# Altium footprint library RDM_ALT_PCB.PcbLib: 127 footprints (part 1 of 8)
Each footprint in its own frame and in the unit in brackets; x right, y up, seen from the top. Pads: shape width x height; smd on the part's side, far side on the other; paste and mask are expansions set on the pad; w line width, h text height; cw(c..) or ccw(c..) is an arc to the next point about the centre after c.
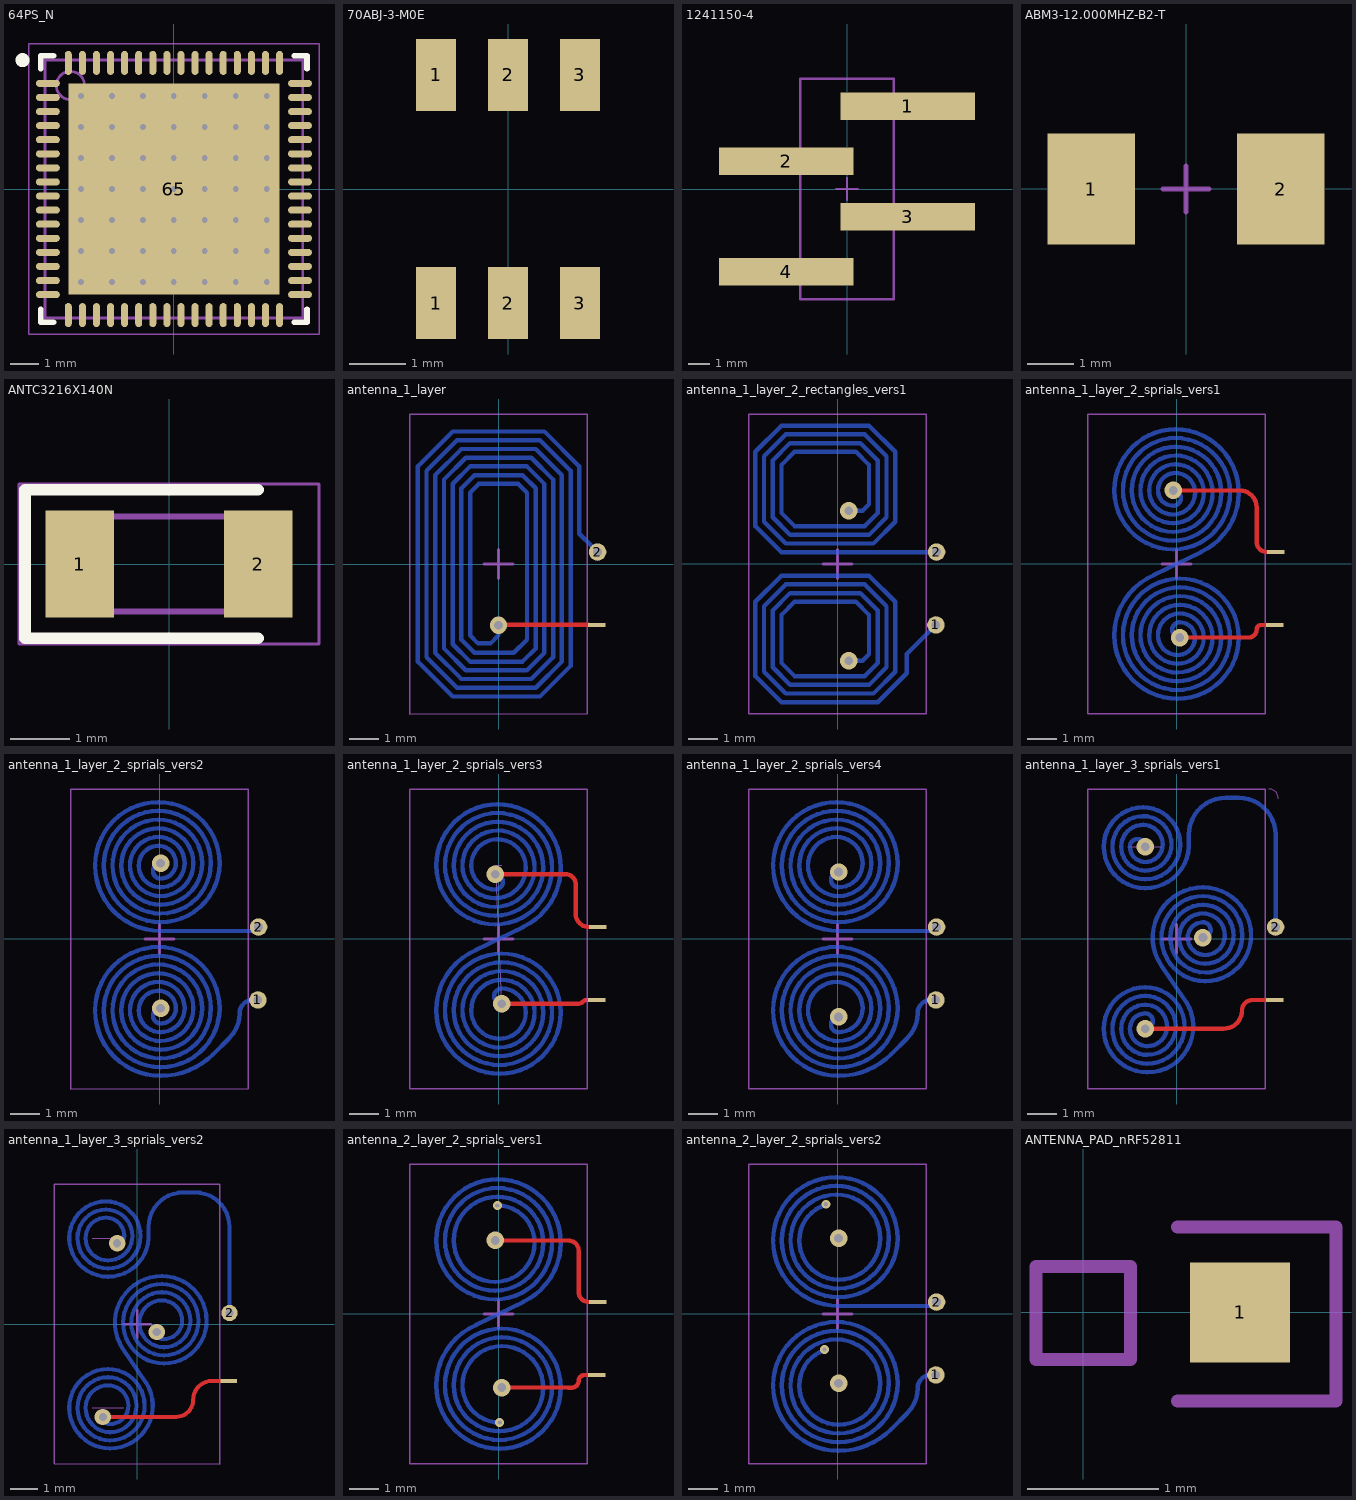
[diagram p0: the footprints below, top view; thin cyan lines are the x and y axes]

## 64PS_N [mm]
pads (65):
  oval 0.85x0.25 smd: 1(-4.475,3.75) 2(-4.475,3.25) 3(-4.475,2.75) 4(-4.475,2.25) 5(-4.475,1.75) 6(-4.475,1.25) 7(-4.475,0.75) 8(-4.475,0.25) 9(-4.475,-0.25) 10(-4.475,-0.75) 11(-4.475,-1.25) 12(-4.475,-1.75) 13(-4.475,-2.25) 14(-4.475,-2.75) 15(-4.475,-3.25) 16(-4.475,-3.75) 33(4.475,-3.75) 34(4.475,-3.25) 35(4.475,-2.75) 36(4.475,-2.25) 37(4.475,-1.75) 38(4.475,-1.25) 39(4.475,-0.75) 40(4.475,-0.25) 41(4.475,0.25) 42(4.475,0.75) 43(4.475,1.25) 44(4.475,1.75) 45(4.475,2.25) 46(4.475,2.75) 47(4.475,3.25) 48(4.475,3.75)
  oval 0.25x0.85 smd: 17(-3.75,-4.475) 18(-3.25,-4.475) 19(-2.75,-4.475) 20(-2.25,-4.475) 21(-1.75,-4.475) 22(-1.25,-4.475) 23(-0.75,-4.475) 24(-0.25,-4.475) 25(0.25,-4.475) 26(0.75,-4.475) 27(1.25,-4.475) 28(1.75,-4.475) 29(2.25,-4.475) 30(2.75,-4.475) 31(3.25,-4.475) 32(3.75,-4.475) 49(3.75,4.475) 50(3.25,4.475) 51(2.75,4.475) 52(2.25,4.475) 53(1.75,4.475) 54(1.25,4.475) 55(0.75,4.475) 56(0.25,4.475) 57(-0.25,4.475) 58(-0.75,4.475) 59(-1.25,4.475) 60(-1.75,4.475) 61(-2.25,4.475) 62(-2.75,4.475) 63(-3.25,4.475) 64(-3.75,4.475)
  rect 7.5x7.5 smd: 65(0,0)
via -3.3,3.3 diameter 0.5 hole 0.2
via -2.2,3.3 diameter 0.5 hole 0.2
via -1.1,3.3 diameter 0.5 hole 0.2
via 0,3.3 diameter 0.5 hole 0.2
via 1.1,3.3 diameter 0.5 hole 0.2
via 2.2,3.3 diameter 0.5 hole 0.2
via 3.3,3.3 diameter 0.5 hole 0.2
via -3.3,2.2 diameter 0.5 hole 0.2
via -2.2,2.2 diameter 0.5 hole 0.2
via -1.1,2.2 diameter 0.5 hole 0.2
via 0,2.2 diameter 0.5 hole 0.2
via 1.1,2.2 diameter 0.5 hole 0.2
via 2.2,2.2 diameter 0.5 hole 0.2
via 3.3,2.2 diameter 0.5 hole 0.2
via -3.3,1.1 diameter 0.5 hole 0.2
via -2.2,1.1 diameter 0.5 hole 0.2
via -1.1,1.1 diameter 0.5 hole 0.2
via 0,1.1 diameter 0.5 hole 0.2
via 1.1,1.1 diameter 0.5 hole 0.2
via 2.2,1.1 diameter 0.5 hole 0.2
via 3.3,1.1 diameter 0.5 hole 0.2
via -3.3,0 diameter 0.5 hole 0.2
via -2.2,0 diameter 0.5 hole 0.2
via -1.1,0 diameter 0.5 hole 0.2
via 0,0 diameter 0.5 hole 0.2
via 1.1,0 diameter 0.5 hole 0.2
via 2.2,0 diameter 0.5 hole 0.2
via 3.3,0 diameter 0.5 hole 0.2
via -3.3,-1.1 diameter 0.5 hole 0.2
via -2.2,-1.1 diameter 0.5 hole 0.2
via -1.1,-1.1 diameter 0.5 hole 0.2
via 0,-1.1 diameter 0.5 hole 0.2
via 1.1,-1.1 diameter 0.5 hole 0.2
via 2.2,-1.1 diameter 0.5 hole 0.2
via 3.3,-1.1 diameter 0.5 hole 0.2
via -3.3,-2.2 diameter 0.5 hole 0.2
via -2.2,-2.2 diameter 0.5 hole 0.2
via -1.1,-2.2 diameter 0.5 hole 0.2
via 0,-2.2 diameter 0.5 hole 0.2
via 1.1,-2.2 diameter 0.5 hole 0.2
via 2.2,-2.2 diameter 0.5 hole 0.2
via 3.3,-2.2 diameter 0.5 hole 0.2
via -3.3,-3.3 diameter 0.5 hole 0.2
via -2.2,-3.3 diameter 0.5 hole 0.2
via -1.1,-3.3 diameter 0.5 hole 0.2
via 0,-3.3 diameter 0.5 hole 0.2
via 1.1,-3.3 diameter 0.5 hole 0.2
via 2.2,-3.3 diameter 0.5 hole 0.2
via 3.3,-3.3 diameter 0.5 hole 0.2
Top Overlay:
  circle w0.25: c-5.375,4.575 r0.125
  lines w0.2: -4.725,-4.275 -4.725,-4.725 -4.275,-4.725 ; -4.725,4.275 -4.725,4.725 -4.275,4.725 ; 4.275,-4.725 4.725,-4.725 4.725,-4.275 ; 4.275,4.725 4.725,4.725 4.725,4.275
Mechanical 13:
  circle w0.1: c-3.675,3.675 r0.5
  lines w0.1: -4.575,-4.575 -4.575,4.575 4.575,4.575 4.575,-4.575 -4.575,-4.575
Mechanical 15:
  lines w0.05: -5.15,-5.15 -5.15,5.15 5.15,5.15 5.15,-5.15 -5.15,-5.15
  lines w0.1: -0.5,0 0.5,0 ; 0,-0.5 0,0.5
3D body: height 1, standoff 0, extent -4.575,-4.575 4.575,4.575

## 70ABJ-3-M0E [mm] "3 Position Spring Compression Contact, Male Connector Surface Mount"
height 3.33
pads (6):
  rect 0.71x1.27 smd: 1(-1.27,-2.015) 1(-1.27,2.015) 2(0,-2.015) 2(0,2.015) 3(1.27,-2.015) 3(1.27,2.015)

## 1241150-4 [mm] "Headers & Wire Housings 4P SINGLE ROW"
height 3.7
pads (4):
  rect 6.2x1.27 smd: 1(2.8,3.81) 2(-2.8,1.27) 3(2.8,-1.27) 4(-2.8,-3.81)
Mechanical 13:
  lines w0.1: -2.15,-5.08 2.15,-5.08 2.15,5.08 -2.15,5.08 -2.15,-5.08
Mechanical 15:
  lines w0.1: -0.5,0 0.5,0 ; 0,-0.5 0,0.5
3D body "CONN_1241150-4_TYCO.stp": height 8.61, standoff 0, extent -2.172,-5.08 2.172,5.08

## ABM3-12.000MHZ-B2-T [mm] "ABM3-12.000MHZ-B2-T"
height 1.3
pads (2):
  rect 1.9x2.4 smd: 1(-2.05,0) 2(2.05,0)
Mechanical 15:
  lines w0.1: -0.5,0 0.5,0 ; 0,-0.5 0,0.5
3D body "ABM3.STEP": height 1.3, standoff 0, extent -2.5,-1.6 2.5,1.6

## ANTC3216X140N [mm]
pads (2):
  rect 1.15x1.8 smd: 1(-1.5,0) 2(1.5,0)
Top Overlay:
  lines w0.2: 1.5,-1.25 -2.425,-1.25 -2.425,1.25 1.5,1.25
Mechanical 15:
  lines w0.1: -1.6,0.225 -1.025,0.8 ; -1.6,-0.8 1.6,-0.8 1.6,0.8 -1.6,0.8 -1.6,-0.8
Mechanical 20:
  lines w0.05: -2.525,-1.35 2.525,-1.35 2.525,1.35 -2.525,1.35 -2.525,-1.35

## antenna_1_layer [mm] "antenna 1 layer"
height 3.7
pads (2):
  rect 0.6x0.15 smd paste-1: 1(3.377,-2.093)
  round 0.6 hole 0.3: 2(3.402,0.411)
via 0,-2.1 diameter 0.6 hole 0.3
Top Layer:
  lines w0.152: 0,-2.093 3.1,-2.093
Bottom Layer:
  lines w0.15: 0,-2.1 0,-2.45 -0.275,-2.725 -0.7,-2.725 -0.973,-2.452 -0.973,2.452 -0.675,2.75 0.675,2.75 0.977,2.448 0.977,-2.6 ; 0.975,-2.6 0.525,-3.05 -0.825,-3.05 -1.275,-2.6 -1.275,2.6 -0.825,3.05 0.825,3.05 1.275,2.6 1.275,-2.9 0.825,-3.35 -0.975,-3.35 -1.573,-2.752 -1.573,2.752 -0.975,3.35 0.975,3.35 1.577,2.748 1.577,-3.048 0.975,-3.65 -1.125,-3.65 -1.873,-2.902 -1.873,2.902 -1.125,3.65 1.125,3.65 1.875,2.9 1.875,-3.2 1.125,-3.95 -1.275,-3.95 -2.173,-3.052 -2.173,3.052 -1.275,3.95 1.275,3.95 2.177,3.048 ; 2.177,3.05 2.177,-3.325 2.177,-3.348 1.275,-4.25 -1.425,-4.25 -2.473,-3.202 -2.473,-3.175 -2.473,3.202 -1.425,4.25 1.425,4.25 2.475,3.2 2.475,-3.5 1.425,-4.55 -1.575,-4.55 -2.775,-3.35 -2.775,3.35 -1.575,4.55 1.575,4.55 2.775,3.35 2.775,1.038 3.207,0.607
Mechanical 15:
  lines w0.05: -3.05,-5.15 3.05,-5.15 3.05,5.15 -3.05,5.15 -3.05,-5.15
  lines w0.1: -0.5,0 0.5,0 ; 0,-0.5 0,0.5

## antenna_1_layer_2_rectangles_vers1 [mm] "antenna 1 layer"
pads (2):
  round 0.6 hole 0.3: 1(3.377,-2.093) 2(3.402,0.411)
via 0.39,-3.325 diameter 0.6 hole 0.3
via 0.389,1.829 diameter 0.6 hole 0.3
Mid-Layer 2:
  lines w0.15: 0.388,1.829 0.39,-3.325
Bottom Layer:
  lines w0.15: 0.395,-3.316 0.864,-3.316 1.081,-3.098 1.081,-1.748 0.631,-1.298 -1.475,-1.298 -1.925,-1.748 -1.925,-3.398 -1.475,-3.848 0.931,-3.848 1.381,-3.398 1.381,-1.598 0.783,-1 -1.627,-1 -2.225,-1.598 -2.225,-3.548 -1.623,-4.15 1.08,-4.15 1.681,-3.548 1.681,-1.448 0.933,-0.7 -1.777,-0.7 -2.525,-1.448 -2.525,-3.698 -1.775,-4.448 1.231,-4.448 1.981,-3.698 1.981,-1.298 1.083,-0.4 -1.927,-0.4 -2.825,-1.298 -2.825,-3.848 -1.923,-4.75 1.356,-4.75 ; 0.395,1.834 0.864,1.834 1.081,2.052 1.081,3.402 0.631,3.852 -1.475,3.852 -1.925,3.402 -1.925,1.752 -1.475,1.302 0.931,1.302 1.381,1.752 1.381,3.552 0.783,4.15 -1.627,4.15 -2.225,3.552 -2.225,1.602 -1.623,1 1.08,1 1.681,1.602 1.681,3.702 0.933,4.45 -1.777,4.45 -2.525,3.702 -2.525,1.452 -1.775,0.702 1.231,0.702 1.981,1.452 1.981,3.852 1.083,4.75 -1.927,4.75 -2.825,3.852 -2.825,1.302 -1.923,0.4 1.801,0.4 3.1,0.4 ; 1.38,-4.75 1.356,-4.75 ; 3.16,-2.31 2.8,-2.67 2.378,-3.092 2.378,-3.75 1.378,-4.75 1.356,-4.75
Mechanical 15:
  lines w0.05: -3.05,-5.15 -3.05,5.15 3.05,5.15 3.05,-5.15 -3.05,-5.15
  lines w0.1: -0.5,0 0.5,0 ; 0,-0.5 0,0.5
3D body: height 0.25, standoff 0, extent 5.15,1.65 5.15,1.65

## antenna_1_layer_2_sprials_vers1 [mm] "antenna 1 layer"
pads (2):
  rect 0.6x0.15 smd: 1(3.377,-2.093) 2(3.402,0.411)
via -0.113,2.525 diameter 0.6 hole 0.3
via 0.112,-2.525 diameter 0.6 hole 0.3
Top Layer:
  lines w0.15: -0.113,2.525 2.175,2.525 cw(c2.175,1.95) 2.75,1.95 2.75,0.761 ccw(c3.1,0.761) 3.1,0.411 ; 0.112,-2.525 0.994,-2.525 ; 0.937,-2.525 2.475,-2.525 ccw(c2.475,-2.25) 2.75,-2.25 cw(c2.907,-2.25) 2.907,-2.093 3.1,-2.093
Bottom Layer:
  lines w0.15: -0.113,2.525 cw(c-0.113,2.263) -0.113,2 cw(c-0.113,2.525) -0.638,2.525 cw(c-0.038,2.525) -0.038,3.125 cw(c-0.038,2.45) 0.637,2.45 cw(c-0.113,2.45) -0.113,1.7 cw(c-0.113,2.525) -0.938,2.525 cw(c-0.038,2.525) -0.038,3.425 cw(c-0.038,2.45) 0.937,2.45 cw(c-0.113,2.45) -0.113,1.4 cw(c-0.113,2.525) -1.238,2.525 cw(c-0.038,2.525) -0.038,3.725 cw(c-0.038,2.45) 1.237,2.45 cw(c-0.113,2.45) -0.113,1.1 cw(c-0.113,2.525) -1.538,2.525 cw(c-0.038,2.525) -0.038,4.025 cw(c-0.038,2.45) 1.537,2.45 cw(c-0.113,2.45) -0.113,0.8 cw(c-0.113,2.525) -1.838,2.525 cw(c-0.038,2.525) -0.038,4.325 cw(c-0.038,2.45) 1.837,2.45 cw(c-0.113,2.45) -0.113,0.5 cw(c-0.113,2.525) -2.138,2.525 cw(c-0.038,2.525) -0.038,4.625 cw(c-0.038,2.45) 2.137,2.45 cw(c-0.113,2.45) 0.855,0.419 -0.782,-0.386 ccw(c0.112,-2.45) -2.137,-2.45 ccw(c0.037,-2.45) 0.037,-4.625 ccw(c0.037,-2.525) 2.137,-2.525 ccw(c0.112,-2.525) 0.112,-0.5 ccw(c0.112,-2.45) -1.837,-2.45 ccw(c0.037,-2.45) 0.037,-4.325 ccw(c0.037,-2.525) 1.837,-2.525 ccw(c0.112,-2.525) 0.112,-0.8 ccw(c0.112,-2.45) -1.537,-2.45 ccw(c0.037,-2.45) 0.037,-4.025 ccw(c0.037,-2.525) 1.537,-2.525 ccw(c0.112,-2.525) 0.112,-1.1 ccw(c0.112,-2.45) -1.237,-2.45 ccw(c0.037,-2.45) 0.037,-3.725 ccw(c0.037,-2.525) 1.237,-2.525 ccw(c0.112,-2.525) 0.112,-1.4 ccw(c0.112,-2.45) -0.937,-2.45 ccw(c0.037,-2.45) 0.037,-3.425 ccw(c0.037,-2.525) 0.937,-2.525 ccw(c0.112,-2.525) 0.112,-1.7 ccw(c0.112,-2.45) -0.637,-2.45 ccw(c0.037,-2.45) 0.037,-3.125 ccw(c0.037,-2.525) 0.637,-2.525 ccw(c0.112,-2.525) 0.112,-2 ccw(c0.112,-2.262) 0.112,-2.525
Mechanical 15:
  lines w0.013: -0.113,2.525 0.112,2.525
  lines w0.05: -3.05,-5.15 -3.05,5.15 3.05,5.15 3.05,-5.15 -3.05,-5.15
  lines w0.1: -0.5,0 0.5,0 ; 0,-0.5 0,0.5

## antenna_1_layer_2_sprials_vers2 [mm] "antenna 1 layer"
pads (2):
  round 0.6 hole 0.3: 1(3.377,-2.093) 2(3.402,0.411)
via 0.038,-2.376 diameter 0.6 hole 0.3
via 0.038,2.601 diameter 0.6 hole 0.3
Mid-Layer 2:
  lines w0.15: 0.038,-2.376 0.038,2.601
Bottom Layer:
  lines w0.15: 0.038,-2.376 ccw(c0.038,-2.638) 0.038,-2.901 ccw(c0.038,-2.376) 0.562,-2.376 ccw(c-0.038,-2.376) -0.038,-1.776 ccw(c-0.038,-2.451) -0.713,-2.451 ccw(c0.038,-2.451) 0.038,-3.201 ccw(c0.038,-2.376) 0.863,-2.376 ccw(c-0.038,-2.376) -0.038,-1.476 ccw(c-0.038,-2.451) -1.012,-2.451 ccw(c0.038,-2.451) 0.038,-3.501 ccw(c0.038,-2.376) 1.162,-2.376 ccw(c-0.038,-2.376) -0.038,-1.176 ccw(c-0.038,-2.451) -1.312,-2.451 ccw(c0.038,-2.451) 0.038,-3.801 ccw(c0.038,-2.376) 1.462,-2.376 ccw(c-0.038,-2.376) -0.038,-0.876 ccw(c-0.038,-2.451) -1.612,-2.451 ccw(c0.038,-2.451) 0.038,-4.101 ccw(c0.038,-2.376) 1.762,-2.376 ccw(c-0.038,-2.376) -0.038,-0.576 ccw(c-0.038,-2.451) -1.912,-2.451 ccw(c0.038,-2.451) 0.038,-4.401 ccw(c0.038,-2.376) 2.062,-2.376 ccw(c-0.038,-2.376) -0.038,-0.276 ccw(c-0.038,-2.451) -2.212,-2.451 ccw(c0.038,-2.451) 0.038,-4.701 ccw(c0.038,-2.137) 1.85,-3.95 2.396,-3.404 ccw(c1.543,-2.55) 2.75,-2.55 cw(c3.207,-2.55) 3.101,-2.105 ; 0.038,2.601 ccw(c0.038,2.338) 0.038,2.076 ccw(c0.038,2.601) 0.562,2.601 ccw(c-0.038,2.601) -0.038,3.201 ccw(c-0.038,2.526) -0.713,2.526 ccw(c0.038,2.526) 0.038,1.776 ccw(c0.038,2.601) 0.863,2.601 ccw(c-0.038,2.601) -0.038,3.501 ccw(c-0.038,2.526) -1.012,2.526 ccw(c0.038,2.526) 0.038,1.476 ccw(c0.038,2.601) 1.162,2.601 ccw(c-0.038,2.601) -0.038,3.801 ccw(c-0.038,2.526) -1.312,2.526 ccw(c0.038,2.526) 0.038,1.176 ccw(c0.038,2.601) 1.462,2.601 ccw(c-0.038,2.601) -0.038,4.101 ccw(c-0.038,2.526) -1.612,2.526 ccw(c0.038,2.526) 0.038,0.876 ccw(c0.038,2.601) 1.762,2.601 ccw(c-0.038,2.601) -0.038,4.401 ccw(c-0.038,2.526) -1.912,2.526 ccw(c0.038,2.526) 0.038,0.576 ccw(c0.038,2.601) 2.062,2.601 ccw(c-0.038,2.601) -0.038,4.701 ccw(c-0.038,2.526) -2.212,2.526 ccw(c0.038,2.526) 0.038,0.276 3.2,0.276
Mechanical 15:
  lines w0.013: -0.188,2.601 0.038,2.601
  lines w0.05: -3.05,-5.15 -3.05,5.15 3.05,5.15 3.05,-5.15 -3.05,-5.15
  lines w0.1: -0.5,0 0.5,0 ; 0,-0.5 0,0.5
3D body: height 0.25, standoff 0, extent 3.742,1.578 3.742,1.578

## antenna_1_layer_2_sprials_vers3 [mm] "antenna 1 layer"
pads (2):
  rect 0.6x0.15 smd: 1(3.377,-2.093) 2(3.402,0.411)
via -0.113,2.225 diameter 0.6 hole 0.3
via 0.112,-2.225 diameter 0.6 hole 0.3
Top Layer:
  lines w0.15: -0.113,2.225 2.3,2.225 cw(c2.3,1.875) 2.65,1.875 2.65,0.861 ccw(c3.1,0.861) 3.1,0.411 ; 0.112,-2.225 2.65,-2.227 2.715,-2.227 ccw(c2.715,-1.965) 2.9,-2.15 cw(c3.037,-2.287) 3.037,-2.093
Top Layer keep-out:
  lines w0.15: 3.037,-2.093 3.15,-2.093
Bottom Layer:
  lines w0.15: -0.113,2.225 cw(c-0.113,1.963) -0.113,1.7 cw(c-0.113,2.525) -0.938,2.525 cw(c-0.038,2.525) -0.038,3.425 cw(c-0.038,2.45) 0.937,2.45 cw(c-0.113,2.45) -0.113,1.4 cw(c-0.113,2.525) -1.238,2.525 cw(c-0.038,2.525) -0.038,3.725 cw(c-0.038,2.45) 1.237,2.45 cw(c-0.113,2.45) -0.113,1.1 cw(c-0.113,2.525) -1.538,2.525 cw(c-0.038,2.525) -0.038,4.025 cw(c-0.038,2.45) 1.537,2.45 cw(c-0.113,2.45) -0.113,0.8 cw(c-0.113,2.525) -1.838,2.525 cw(c-0.038,2.525) -0.038,4.325 cw(c-0.038,2.45) 1.837,2.45 cw(c-0.113,2.45) -0.113,0.5 cw(c-0.113,2.525) -2.138,2.525 cw(c-0.038,2.525) -0.038,4.625 cw(c-0.038,2.45) 2.137,2.45 cw(c-0.113,2.45) 0.855,0.419 -0.782,-0.386 ccw(c0.112,-2.45) -2.137,-2.45 ccw(c0.037,-2.45) 0.037,-4.625 ccw(c0.037,-2.525) 2.137,-2.525 ccw(c0.112,-2.525) 0.112,-0.5 ccw(c0.112,-2.45) -1.837,-2.45 ccw(c0.037,-2.45) 0.037,-4.325 ccw(c0.037,-2.525) 1.837,-2.525 ccw(c0.112,-2.525) 0.112,-0.8 ccw(c0.112,-2.45) -1.537,-2.45 ccw(c0.037,-2.45) 0.037,-4.025 ccw(c0.037,-2.525) 1.537,-2.525 ccw(c0.112,-2.525) 0.112,-1.1 ccw(c0.112,-2.45) -1.237,-2.45 ccw(c0.037,-2.45) 0.037,-3.725 ccw(c0.037,-2.525) 1.237,-2.525 ccw(c0.112,-2.525) 0.112,-1.4 ccw(c0.112,-2.45) -0.937,-2.45 ccw(c0.037,-2.45) 0.037,-3.425 ccw(c0.037,-2.525) 0.937,-2.525 ccw(c0.112,-2.525) 0.112,-1.7 ccw(c0.112,-1.962) 0.112,-2.225
Mechanical 15:
  lines w0.013: 0.112,-2.525 -0.113,2.525 0.112,2.525
  lines w0.05: -3.05,-5.15 -3.05,5.15 3.05,5.15 3.05,-5.15 -3.05,-5.15
  lines w0.1: -0.5,0 0.5,0 ; 0,-0.5 0,0.5

## antenna_1_layer_2_sprials_vers4 [mm] "antenna 1 layer"
pads (2):
  round 0.6 hole 0.3: 1(3.377,-2.093) 2(3.402,0.411)
via 0.037,2.301 diameter 0.6 hole 0.3
via 0.037,-2.676 diameter 0.6 hole 0.3
Mid-Layer 2:
  lines w0.15: 0.037,-2.676 0.037,2.301
Bottom Layer:
  lines w0.15: 0.037,-2.676 ccw(c0.037,-2.938) 0.037,-3.201 ccw(c0.037,-2.376) 0.862,-2.376 ccw(c-0.038,-2.376) -0.038,-1.476 ccw(c-0.038,-2.451) -1.013,-2.451 ccw(c0.037,-2.451) 0.037,-3.501 ccw(c0.037,-2.376) 1.162,-2.376 ccw(c-0.038,-2.376) -0.038,-1.176 ccw(c-0.038,-2.451) -1.313,-2.451 ccw(c0.037,-2.451) 0.037,-3.801 ccw(c0.037,-2.376) 1.462,-2.376 ccw(c-0.038,-2.376) -0.038,-0.876 ccw(c-0.038,-2.451) -1.613,-2.451 ccw(c0.037,-2.451) 0.037,-4.101 ccw(c0.037,-2.376) 1.762,-2.376 ccw(c-0.038,-2.376) -0.038,-0.576 ccw(c-0.038,-2.451) -1.913,-2.451 ccw(c0.037,-2.451) 0.037,-4.401 ccw(c0.037,-2.376) 2.062,-2.376 ccw(c-0.038,-2.376) -0.038,-0.276 ccw(c-0.038,-2.451) -2.212,-2.451 ccw(c0.037,-2.451) 0.037,-4.701 ccw(c0.037,-2.137) 1.85,-3.95 2.396,-3.404 ccw(c1.543,-2.55) 2.75,-2.55 cw(c3.207,-2.55) 3.101,-2.105 ; 0.037,2.301 ccw(c0.037,2.038) 0.037,1.776 ccw(c0.037,2.601) 0.862,2.601 ccw(c-0.038,2.601) -0.038,3.501 ccw(c-0.038,2.526) -1.013,2.526 ccw(c0.037,2.526) 0.037,1.476 ccw(c0.037,2.601) 1.162,2.601 ccw(c-0.038,2.601) -0.038,3.801 ccw(c-0.038,2.526) -1.313,2.526 ccw(c0.037,2.526) 0.037,1.176 ccw(c0.037,2.601) 1.462,2.601 ccw(c-0.038,2.601) -0.038,4.101 ccw(c-0.038,2.526) -1.613,2.526 ccw(c0.037,2.526) 0.037,0.876 ccw(c0.037,2.601) 1.762,2.601 ccw(c-0.038,2.601) -0.038,4.401 ccw(c-0.038,2.526) -1.913,2.526 ccw(c0.037,2.526) 0.037,0.576 ccw(c0.037,2.601) 2.062,2.601 ccw(c-0.038,2.601) -0.038,4.701 ccw(c-0.038,2.526) -2.212,2.526 ccw(c0.037,2.526) 0.037,0.276 3.2,0.276
Mechanical 15:
  lines w0.05: -3.05,-5.15 3.05,-5.15 3.05,5.15 -3.05,5.15 -3.05,-5.15
  lines w0.1: -0.5,0 0.5,0 ; 0,-0.5 0,0.5
3D body: height 0.25, standoff 0, extent -3.953,1.679 -3.953,1.679

## antenna_1_layer_3_sprials_vers1 [mm] "antenna 1 layer"
pads (2):
  rect 0.6x0.15 smd: 1(3.377,-2.093)
  round 0.6 hole 0.3: 2(3.402,0.411)
via -1.074,3.17 diameter 0.6 hole 0.3
via 0.909,0.05 diameter 0.6 hole 0.3
via -1.074,-3.08 diameter 0.6 hole 0.3
Top Layer:
  lines w0.15: -1.074,-3.08 1.25,-3.078 1.622,-3.078 ccw(c1.622,-2.45) 2.25,-2.45 cw(c2.607,-2.45) 2.607,-2.093 3.1,-2.093
Mid-Layer 2:
  lines w0.15: -1.074,1.315 -1.074,3.17 ; -1.07,1.315 ccw(c0.196,1.315) 0.196,0.05 0.909,0.05
Bottom Layer:
  lines w0.15: -1.074,-3.08 ccw(c-1.074,-2.817) -1.074,-2.555 ccw(c-1.074,-3.08) -1.599,-3.08 ccw(c-0.999,-3.08) -0.999,-3.68 ccw(c-0.999,-3.005) -0.324,-3.005 ccw(c-1.074,-3.005) -1.074,-2.255 ccw(c-1.074,-3.08) -1.899,-3.08 ccw(c-0.999,-3.08) -0.999,-3.98 ccw(c-0.999,-3.005) -0.024,-3.005 ccw(c-1.074,-3.005) -1.074,-1.955 ccw(c-1.074,-3.08) -2.199,-3.08 ccw(c-0.999,-3.08) -0.999,-4.28 ccw(c-0.999,-3.005) 0.276,-3.005 ccw(c-1.074,-3.005) -1.074,-1.655 ccw(c-1.074,-3.08) -2.499,-3.08 ccw(c-0.999,-3.08) -0.999,-4.58 ccw(c-0.999,-3.005) 0.336,-2.17 ; -1.074,3.17 ccw(c-1.337,3.17) -1.599,3.17 ccw(c-1.074,3.17) -1.074,2.645 ccw(c-1.074,3.245) -0.474,3.245 ccw(c-1.149,3.245) -1.149,3.92 ccw(c-1.149,3.17) -1.899,3.17 ccw(c-1.074,3.17) -1.074,2.345 ccw(c-1.074,3.245) -0.174,3.245 ccw(c-1.149,3.245) -1.149,4.22 ccw(c-1.149,3.17) -2.199,3.17 ccw(c-1.074,3.17) -1.074,2.045 ccw(c-1.074,3.245) 0.126,3.245 ccw(c-1.149,3.245) -1.149,4.52 ccw(c-1.149,3.17) -2.499,3.17 ccw(c-1.074,3.17) -1.074,1.745 ccw(c-1.074,3.245) 0.424,3.172 0.424,3.58 cw(c1.694,3.58) 1.694,4.85 2.132,4.85 cw(c2.132,3.58) 3.402,3.58 3.402,2.13 3.402,0.7 ; -0.402,-0.524 cw(c0.984,0.05) -0.516,0.05 ; 0.332,-2.173 -0.526,-0.908 cw(c0.909,0.05) 0.909,1.775 cw(c0.909,0.125) 2.559,0.125 cw(c0.984,0.125) 0.984,-1.45 cw(c0.984,0.05) -0.516,0.05 ; 0.909,0.05 ccw(c0.909,0.312) 0.909,0.575 ccw(c0.909,0.05) 0.384,0.05 ccw(c0.984,0.05) 0.984,-0.55 ccw(c0.984,0.125) 1.659,0.125 ccw(c0.909,0.125) 0.909,0.875 ccw(c0.909,0.05) 0.084,0.05 ccw(c0.984,0.05) 0.984,-0.85 ccw(c0.984,0.125) 1.959,0.125 ccw(c0.909,0.125) 0.909,1.175 ccw(c0.909,0.05) -0.216,0.05 ccw(c0.984,0.05) 0.984,-1.15 ccw(c0.984,0.125) 2.259,0.125 ccw(c0.909,0.125) 0.909,1.475 ccw(c0.909,0.05) -0.516,0.05
Mechanical 15:
  lines w0.01: 3.17,5.15 cw(c3.17,4.82) 3.5,4.82
  lines w0.013: -1.648,3.17 -0.5,3.17
  lines w0.05: -3.05,-5.15 3.05,-5.15 3.05,5.15 -3.05,5.15 -3.05,-5.15
  lines w0.1: -0.5,0 0.5,0 ; 0,-0.5 0,0.5
3D body: height 0.25, standoff 0, extent 4.451,1.65 4.451,1.65

## antenna_1_layer_3_sprials_vers2 [mm] "antenna 1 layer"
pads (2):
  rect 0.6x0.15 smd: 1(3.377,-2.093)
  round 0.6 hole 0.3: 2(3.402,0.411)
via -1.262,-3.417 diameter 0.6 hole 0.3
via -0.737,2.98 diameter 0.6 hole 0.3
via 0.722,-0.288 diameter 0.6 hole 0.3
Top Layer:
  lines w0.15: -1.262,-3.417 1.063,-3.416 1.434,-3.416 ccw(c1.434,-2.788) 2.063,-2.788 cw(c2.757,-2.788) 2.757,-2.093 3.1,-2.093
Mid-Layer 2:
  lines w0.15: -0.737,2.83 ccw(c2.33,2.83) 0.161,0.662 0.446,0.378 cw(c-0.219,-0.288) 0.722,-0.288
Bottom Layer:
  lines w0.15: -1.262,-3.417 ccw(c-0.999,-3.417) -0.999,-3.68 ccw(c-0.999,-3.005) -0.324,-3.005 ccw(c-1.074,-3.005) -1.074,-2.255 ccw(c-1.074,-3.08) -1.899,-3.08 ccw(c-0.999,-3.08) -0.999,-3.98 ccw(c-0.999,-3.005) -0.024,-3.005 ccw(c-1.074,-3.005) -1.074,-1.955 ccw(c-1.074,-3.08) -2.199,-3.08 ccw(c-0.999,-3.08) -0.999,-4.28 ccw(c-0.999,-3.005) 0.276,-3.005 ccw(c-1.074,-3.005) -1.074,-1.655 ccw(c-1.074,-3.08) -2.499,-3.08 ccw(c-0.999,-3.08) -0.999,-4.58 ccw(c-0.999,-3.005) 0.336,-2.17 ; -0.737,2.98 ccw(c-0.737,3.243) -0.474,3.245 ccw(c-1.149,3.245) -1.149,3.92 ccw(c-1.149,3.17) -1.899,3.17 ccw(c-1.074,3.17) -1.074,2.345 ccw(c-1.074,3.245) -0.174,3.245 ccw(c-1.149,3.245) -1.149,4.22 ccw(c-1.149,3.17) -2.199,3.17 ccw(c-1.074,3.17) -1.074,2.045 ccw(c-1.074,3.245) 0.126,3.245 ccw(c-1.149,3.245) -1.149,4.52 ccw(c-1.149,3.17) -2.499,3.17 ccw(c-1.074,3.17) -1.074,1.745 ccw(c-1.074,3.245) 0.424,3.172 0.424,3.58 cw(c1.694,3.58) 1.694,4.85 2.132,4.85 cw(c2.132,3.58) 3.402,3.58 3.402,2.13 3.402,0.65 ; -0.402,-0.524 cw(c0.984,0.05) -0.516,0.05 ; 0.332,-2.173 -0.526,-0.908 cw(c0.909,0.05) 0.909,1.775 cw(c0.909,0.125) 2.559,0.125 cw(c0.984,0.125) 0.984,-1.45 cw(c0.984,0.05) -0.516,0.05 ; 0.722,-0.288 ccw(c0.984,-0.288) 0.984,-0.55 ccw(c0.984,0.125) 1.659,0.125 ccw(c0.909,0.125) 0.909,0.875 ccw(c0.909,0.05) 0.084,0.05 ccw(c0.984,0.05) 0.984,-0.85 ccw(c0.984,0.125) 1.959,0.125 ccw(c0.909,0.125) 0.909,1.175 ccw(c0.909,0.05) -0.216,0.05 ccw(c0.984,0.05) 0.984,-1.15 ccw(c0.984,0.125) 2.259,0.125 ccw(c0.909,0.125) 0.909,1.475 ccw(c0.909,0.05) -0.516,0.05
Mechanical 15:
  lines w0.013: -1.648,-3.08 -0.5,-3.08 ; -1.648,3.17 -0.5,3.17
  lines w0.05: -3.05,-5.15 -3.05,5.15 3.05,5.15 3.05,-5.15 -3.05,-5.15
  lines w0.1: -0.5,0 0.5,0 ; 0,-0.5 0,0.5
3D body: height 0.25, standoff 0, extent -4.451,1.65 -4.451,1.65

## antenna_2_layer_2_sprials_vers1 [mm] "antenna 2 layer"
pads (2):
  rect 0.6x0.15 smd: 1(3.377,-2.093) 2(3.402,0.411)
via 0.037,-3.725 diameter 0.3 hole 0.15
via -0.038,3.725 diameter 0.3 hole 0.15
via 0.112,-2.525 diameter 0.6 hole 0.3
via -0.113,2.525 diameter 0.6 hole 0.3
Top Layer:
  lines w0.15: -0.113,2.525 2.4,2.525 cw(c2.4,2.175) 2.75,2.175 2.75,0.761 ccw(c3.1,0.761) 3.1,0.411 ; 0.112,-2.525 2.4,-2.526 2.524,-2.526 ccw(c2.524,-2.3) 2.75,-2.3 cw(c2.957,-2.3) 2.957,-2.093 3.1,-2.093
Mid-Layer 2:
  lines w0.15: -0.113,2.525 cw(c-0.113,2.263) -0.113,2 cw(c-0.113,2.525) -0.638,2.525 cw(c-0.038,2.525) -0.038,3.125 cw(c-0.038,2.45) 0.637,2.45 cw(c-0.113,2.45) -0.113,1.7 cw(c-0.113,2.525) -0.938,2.525 cw(c-0.038,2.525) -0.038,3.425 cw(c-0.038,2.45) 0.937,2.45 cw(c-0.113,2.45) -0.113,1.4 cw(c-0.113,2.525) -1.238,2.525 cw(c-0.038,2.525) -0.038,3.725 ; 0.037,-3.725 ccw(c0.037,-2.525) 1.237,-2.525 ccw(c0.112,-2.525) 0.112,-1.4 ccw(c0.112,-2.45) -0.937,-2.45 ccw(c0.037,-2.45) 0.037,-3.425 ccw(c0.037,-2.525) 0.937,-2.525 ccw(c0.112,-2.525) 0.112,-1.7 ccw(c0.112,-2.45) -0.637,-2.45 ccw(c0.037,-2.45) 0.037,-3.125 ccw(c0.037,-2.525) 0.637,-2.525 ccw(c0.112,-2.525) 0.112,-2 ccw(c0.112,-2.262) 0.112,-2.525
Bottom Layer:
  lines w0.15: -0.038,3.725 cw(c-0.038,2.45) 1.237,2.45 cw(c-0.113,2.45) -0.113,1.1 cw(c-0.113,2.525) -1.538,2.525 cw(c-0.038,2.525) -0.038,4.025 cw(c-0.038,2.45) 1.537,2.45 cw(c-0.113,2.45) -0.113,0.8 cw(c-0.113,2.525) -1.838,2.525 cw(c-0.038,2.525) -0.038,4.325 cw(c-0.038,2.45) 1.837,2.45 cw(c-0.113,2.45) -0.113,0.5 cw(c-0.113,2.525) -2.138,2.525 cw(c-0.038,2.525) -0.038,4.625 cw(c-0.038,2.45) 2.137,2.45 cw(c-0.113,2.45) 0.855,0.419 -0.782,-0.386 ccw(c0.112,-2.45) -2.137,-2.45 ccw(c0.037,-2.45) 0.037,-4.625 ccw(c0.037,-2.525) 2.137,-2.525 ccw(c0.112,-2.525) 0.112,-0.5 ccw(c0.112,-2.45) -1.837,-2.45 ccw(c0.037,-2.45) 0.037,-4.325 ccw(c0.037,-2.525) 1.837,-2.525 ccw(c0.112,-2.525) 0.112,-0.8 ccw(c0.112,-2.45) -1.537,-2.45 ccw(c0.037,-2.45) 0.037,-4.025 ccw(c0.037,-2.525) 1.537,-2.525 ccw(c0.112,-2.525) 0.112,-1.1 ccw(c0.112,-2.45) -1.237,-2.45 ccw(c0.037,-2.45) 0.037,-3.725
Mechanical 15:
  lines w0.013: -0.113,2.525 0.112,2.525
  lines w0.05: -3.05,-5.15 3.05,-5.15 3.05,5.15 -3.05,5.15 -3.05,-5.15
  lines w0.1: -0.5,0 0.5,0 ; 0,-0.5 0,0.5

## antenna_2_layer_2_sprials_vers2 [mm] "antenna 2 layer"
pads (2):
  round 0.6 hole 0.3: 1(3.377,-2.093) 2(3.402,0.411)
via 0.037,2.601 diameter 0.6 hole 0.3
via 0.037,-2.376 diameter 0.6 hole 0.3
via -0.445,-1.22 diameter 0.3 hole 0.15
via -0.399,3.772 diameter 0.3 hole 0.15
Mid-Layer 1:
  lines w0.15: 0.037,-2.376 0.037,2.601
Mid-Layer 2:
  lines w0.15: -0.436,-1.244 cw(c-0.038,-2.376) 1.162,-2.376 cw(c0.037,-2.376) 0.037,-3.501 cw(c0.037,-2.451) -1.012,-2.451 cw(c-0.038,-2.451) -0.038,-1.476 cw(c-0.038,-2.376) 0.862,-2.376 cw(c0.037,-2.376) 0.037,-3.201 cw(c0.037,-2.451) -0.713,-2.451 cw(c-0.038,-2.451) -0.038,-1.776 cw(c-0.038,-2.376) 0.562,-2.376 cw(c0.037,-2.376) 0.037,-2.901 cw(c0.037,-2.638) 0.037,-2.376 ; -0.392,3.747 cw(c-0.038,2.601) 1.162,2.601 cw(c0.037,2.601) 0.037,1.476 cw(c0.037,2.526) -1.012,2.526 cw(c-0.038,2.526) -0.038,3.501 cw(c-0.038,2.601) 0.862,2.601 cw(c0.037,2.601) 0.037,1.776 cw(c0.037,2.526) -0.713,2.526 cw(c-0.038,2.526) -0.038,3.201 cw(c-0.038,2.601) 0.562,2.601 cw(c0.037,2.601) 0.037,2.076 cw(c0.037,2.338) 0.037,2.601
Bottom Layer:
  lines w0.15: -0.438,-1.24 ccw(c-0.038,-2.451) -1.313,-2.451 ccw(c0.037,-2.451) 0.037,-3.801 ccw(c0.037,-2.376) 1.462,-2.376 ccw(c-0.038,-2.376) -0.038,-0.876 ccw(c-0.038,-2.451) -1.613,-2.451 ccw(c0.037,-2.451) 0.037,-4.101 ccw(c0.037,-2.376) 1.762,-2.376 ccw(c-0.038,-2.376) -0.038,-0.576 ccw(c-0.038,-2.451) -1.913,-2.451 ccw(c0.037,-2.451) 0.037,-4.401 ccw(c0.037,-2.376) 2.062,-2.376 ccw(c-0.038,-2.376) -0.038,-0.276 ccw(c-0.038,-2.451) -2.212,-2.451 ccw(c0.037,-2.451) 0.037,-4.701 ccw(c0.037,-2.137) 1.85,-3.95 2.396,-3.404 ccw(c1.543,-2.55) 2.75,-2.55 cw(c3.207,-2.55) 3.101,-2.105 ; -0.393,3.75 ccw(c-0.038,2.526) -1.313,2.526 ccw(c0.037,2.526) 0.037,1.176 ccw(c0.037,2.601) 1.462,2.601 ccw(c-0.038,2.601) -0.038,4.101 ccw(c-0.038,2.526) -1.613,2.526 ccw(c0.037,2.526) 0.037,0.876 ccw(c0.037,2.601) 1.762,2.601 ccw(c-0.038,2.601) -0.038,4.401 ccw(c-0.038,2.526) -1.913,2.526 ccw(c0.037,2.526) 0.037,0.576 ccw(c0.037,2.601) 2.062,2.601 ccw(c-0.038,2.601) -0.038,4.701 ccw(c-0.038,2.526) -2.212,2.526 ccw(c0.037,2.526) 0.037,0.276 3.2,0.276
Mechanical 15:
  lines w0.013: -0.188,2.601 0.037,2.601
  lines w0.05: -3.05,-5.15 3.05,-5.15 3.05,5.15 -3.05,5.15 -3.05,-5.15
  lines w0.1: -0.5,0 0.5,0 ; 0,-0.5 0,0.5
3D body: height 0.25, standoff 0, extent 3.742,1.578 3.742,1.578

## ANTENNA_PAD_nRF52811 [mil] "open end one wire antenna for 2.4GHz"
pads (1):
  rect 30x30 smd: 1(47.05,0)
Mechanical 15:
  lines w3.94: 28.35,-26.57 75.79,-26.57 75.79,25.59 28.35,25.59 ; -14.17,-14.17 -14.17,13.78 14.17,13.78 14.17,-14.17 -14.17,-14.17